# Altium footprint library AD_Lib.PcbLib: 508 footprints (part 21 of 32)
Each footprint in its own frame and in the unit in brackets; x right, y up, seen from the top. Pads: shape width x height; smd on the part's side, far side on the other; paste and mask are expansions set on the pad; w line width, h text height; cw(c..) or ccw(c..) is an arc to the next point about the centre after c.
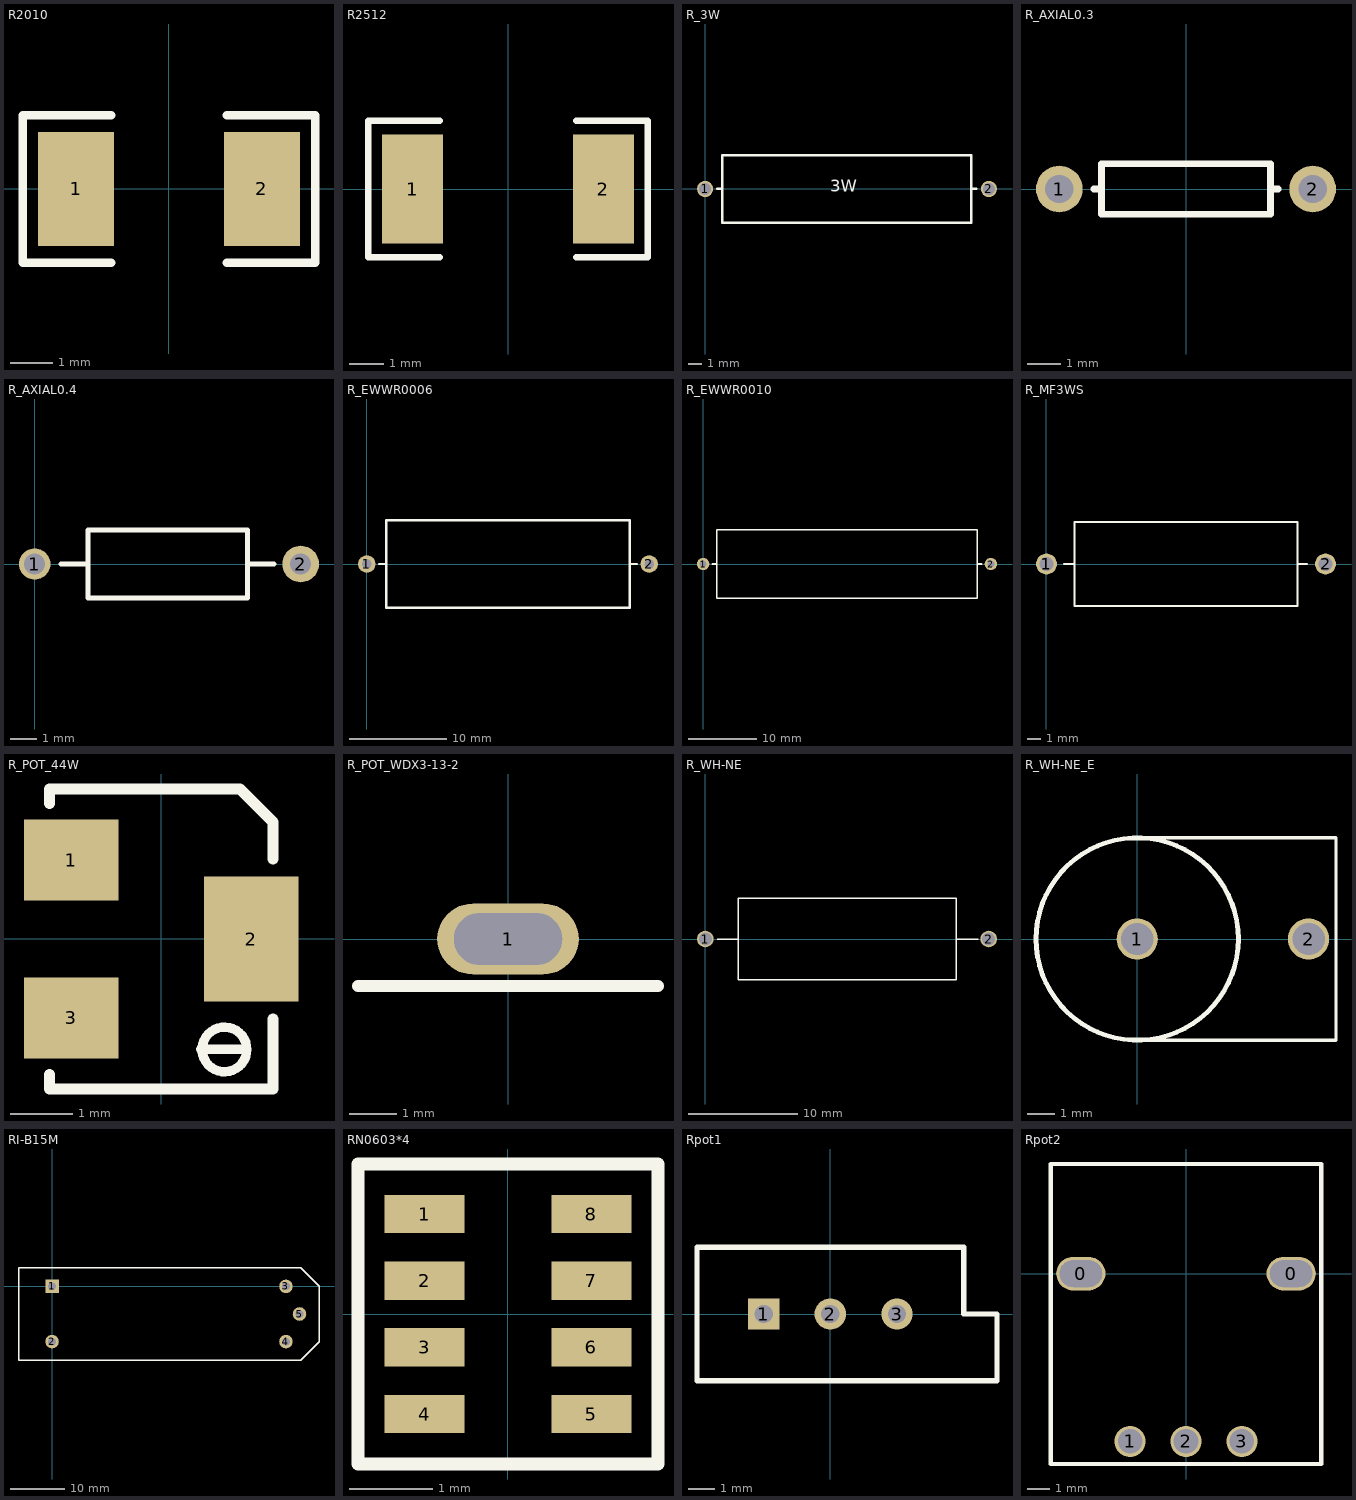
[diagram p20: the footprints below, top view; thin cyan lines are the x and y axes]

## R2010 [mm] "Chip Resistor; Body 5.0 x 2.5 mm (LxW typ)"
height 0.71
pads (2):
  rect 1.8x2.7 smd: 1(-2.2,0) 2(2.2,0)
Top Overlay:
  lines w0.2: -1.365,-1.746 -3.465,-1.746 -3.465,1.746 -1.365,1.746 ; 1.365,-1.746 3.465,-1.746 3.465,1.746 1.365,1.746

## R2512 [mm] "公制6432；英制2512；功率1W"
height 0.7
pads (2):
  rect 1.8x3.2 smd: 1(-2.8,0) 2(2.8,0)
Top Overlay:
  lines w0.2: -2,-2 -4.1,-2 -4.1,2 -2,2 ; 2,-2 4.1,-2 4.1,2 2,2

## R_3W [mm] "功率电阻"
height 5
pads (2):
  round 1.2 hole 0.9: 1(0,0) 2(21,0)
Top Overlay:
  lines w0.178: 0.889,0 1.27,0 ; 19.685,0 20.066,0 ; 1.27,-2.5 1.27,2.492 19.685,2.492 19.685,-2.5 1.27,-2.5
  text "3W" at 9.271,-0.508 h1.52

## R_AXIAL0.3 [mm] "Axial Device, Thru-Hole; 2 Leads; 0.3 in Pin Spacing"
height 1.524
pads (2):
  round 1.4 hole 0.85: 1(-3.81,0) 2(3.81,0)
Top Overlay:
  lines w0.2: -2.769,0 -2.54,0 ; 2.769,0 2.54,0 ; 2.54,0 2.54,0.762 -2.54,0.762 -2.54,-0.762 2.54,-0.762 2.54,0

## R_AXIAL0.4 [mm] "Axial Device, Thru-Hole; 2 Leads; 0.4 in Pin Spacing"
height 2.6
pads (2):
  round 1.2 hole 0.8: 1(0,0)
  round 1.4 hole 0.8: 2(10.16,0)
Top Overlay:
  lines w0.2: 1.016,0 2.032,0 ; 8.128,0 9.144,0 ; 2.032,-1.3 2.032,1.3 8.128,1.3 8.128,-1.3 2.032,-1.3

## R_EWWR0006 [mm] "开步睿思之EWWR0006系列工具电阻，如EWWR0006J12R0T9"
height 9
pads (2):
  round 1.8 hole 1: 1(0,0) 2(29,0)
Top Overlay:
  lines w0.254: 1.27,0 2,0 ; 27,0 27.73,0 ; 2,-4.5 27,-4.5 27,4.5 2,4.5 2,-4.5

## R_EWWR0010 [mm] "开步睿思之EWWR0010系列工具电阻，如EWWR0010J12R0T9"
height 10
pads (2):
  round 1.8 hole 1: 1(0,0) 2(42,0)
Top Overlay:
  lines w0.254: 1.315,0 2,0 ; 40,0 40.685,0 ; 2,-5 40,-5 40,5 2,5 2,-5

## R_MF3WS [mm] "UNI-ROYAL功率电阻之MFR03S系列，如MFR03SF330KA10"
height 6
pads (2):
  round 1.5 hole 1: 1(0,0) 2(20,0)
Top Overlay:
  lines w0.152: 1.27,0 2,0 ; 18,0 18.669,0 ; 2,-3 18,-3 18,3 2,3 2,-3

## R_POT_44W [mm] "表贴电位器，如44WR10KLFT7"
height 5.08
pads (3):
  rect 1.52x1.3 smd: 1(-1.45,1.27) 3(-1.45,-1.27)
  rect 1.52x2.01 smd: 2(1.45,0)
Top Overlay:
  circle w0.152: c1.016,-1.778 r0.359
  lines w0.152: 0.635,-1.778 1.375,-1.778
  lines w0.178: -1.8,-2.181 -1.8,-2.415 1.8,-2.415 1.8,-1.292 ; -1.8,2.181 -1.8,2.415 1.268,2.415 1.8,1.883 1.8,1.292

## R_POT_WDX3-13-2 [mm] "BOCHEN(博晨)"
height 14
pads (1):
  oval 3x1.5 hole 1.1 slot 2.286 at 0 deg: 1(0,0)
Top Overlay:
  lines w0.254: -3.175,-1 3.175,-1

## R_WH-NE [mil] "Ohmite功率电阻WH，WN系列"
height 295.28
pads (2):
  round 60 hole 47.24: 1(0,0) 2(1023.86,0)
Top Overlay:
  lines w5: 42.72,0 117.72,0 ; 905.75,0 985.75,0 ; 118.35,-147.64 118.35,147.64 905.75,147.64 905.75,-147.64 118.35,-147.64

## R_WH-NE_E [mil] "Ohmite功率电阻WH，WN系列(直立)"
height 984.25
pads (2):
  round 60 hole 47.24: 1(0,0) 2(250,0)
Top Overlay:
  circle w7: c0,0 r147.64
  lines w5: 0,-147.64 290,-147.64 290,147.64 0,147.64

## RI-B15M [mm] "安川继电器"
height 5.639
pads (5):
  rect 2.5x2.5 hole 1.4: 1(0,0)
  round 2.5 hole 1.4: 2(0,-10.2) 3(43.2,0) 4(43.2,-10.2) 5(45.7,-5.1)
Top Overlay:
  lines w0.254: -6.1,-13.6 45.974,-13.6 49.276,-10.298 49.276,-10.287 49.3,-10.263 49.3,0 45.9,3.4 -6.1,3.4 -6.1,-13.6

## RN0603*4 [mm]
height 0.7
pads (8):
  rect 0.96x0.46 smd: 1(-1,1.2) 2(-1,0.4) 3(-1,-0.4) 4(-1,-1.2) 5(1,-1.2) 6(1,-0.4) 7(1,0.4) 8(1,1.2)
Top Overlay:
  lines w0.152: -1.8,-1.8 1.8,-1.8 1.8,1.8 -1.8,1.8 -1.8,-1.8

## Rpot1 [mm] "Variable Resistor, Thru-Hole; 3 Leads"
height 4.65
pads (3):
  rect 1.2x1.2 hole 0.7: 1(-2.54,0)
  round 1.2 hole 0.7: 2(0,0) 3(2.54,0)
Top Overlay:
  lines w0.2: -5.08,-2.54 -5.08,2.54 5.08,2.54 5.08,0 6.35,0 6.35,-2.54 -5.08,-2.54

## Rpot2 [mm] "Variable Resistor, Thru-Hole; 3 Leads"
height 4.65
pads (5):
  oval 2.2x1.5 hole 1.2 slot 1.9 at 0 deg: 0(-4.7,0) 0(4.7,0)
  round 1.4 hole 1.1: 1(-2.5,-7.5) 2(0,-7.5) 3(2.5,-7.5)
Top Overlay:
  lines w0.2: -6.05,-8.509 6.05,-8.509 6.05,4.9 -6.05,4.9 -6.05,-8.509